# Altium integrated library 兰格封装.IntLib: 1176 symbols (part 3 of 6)
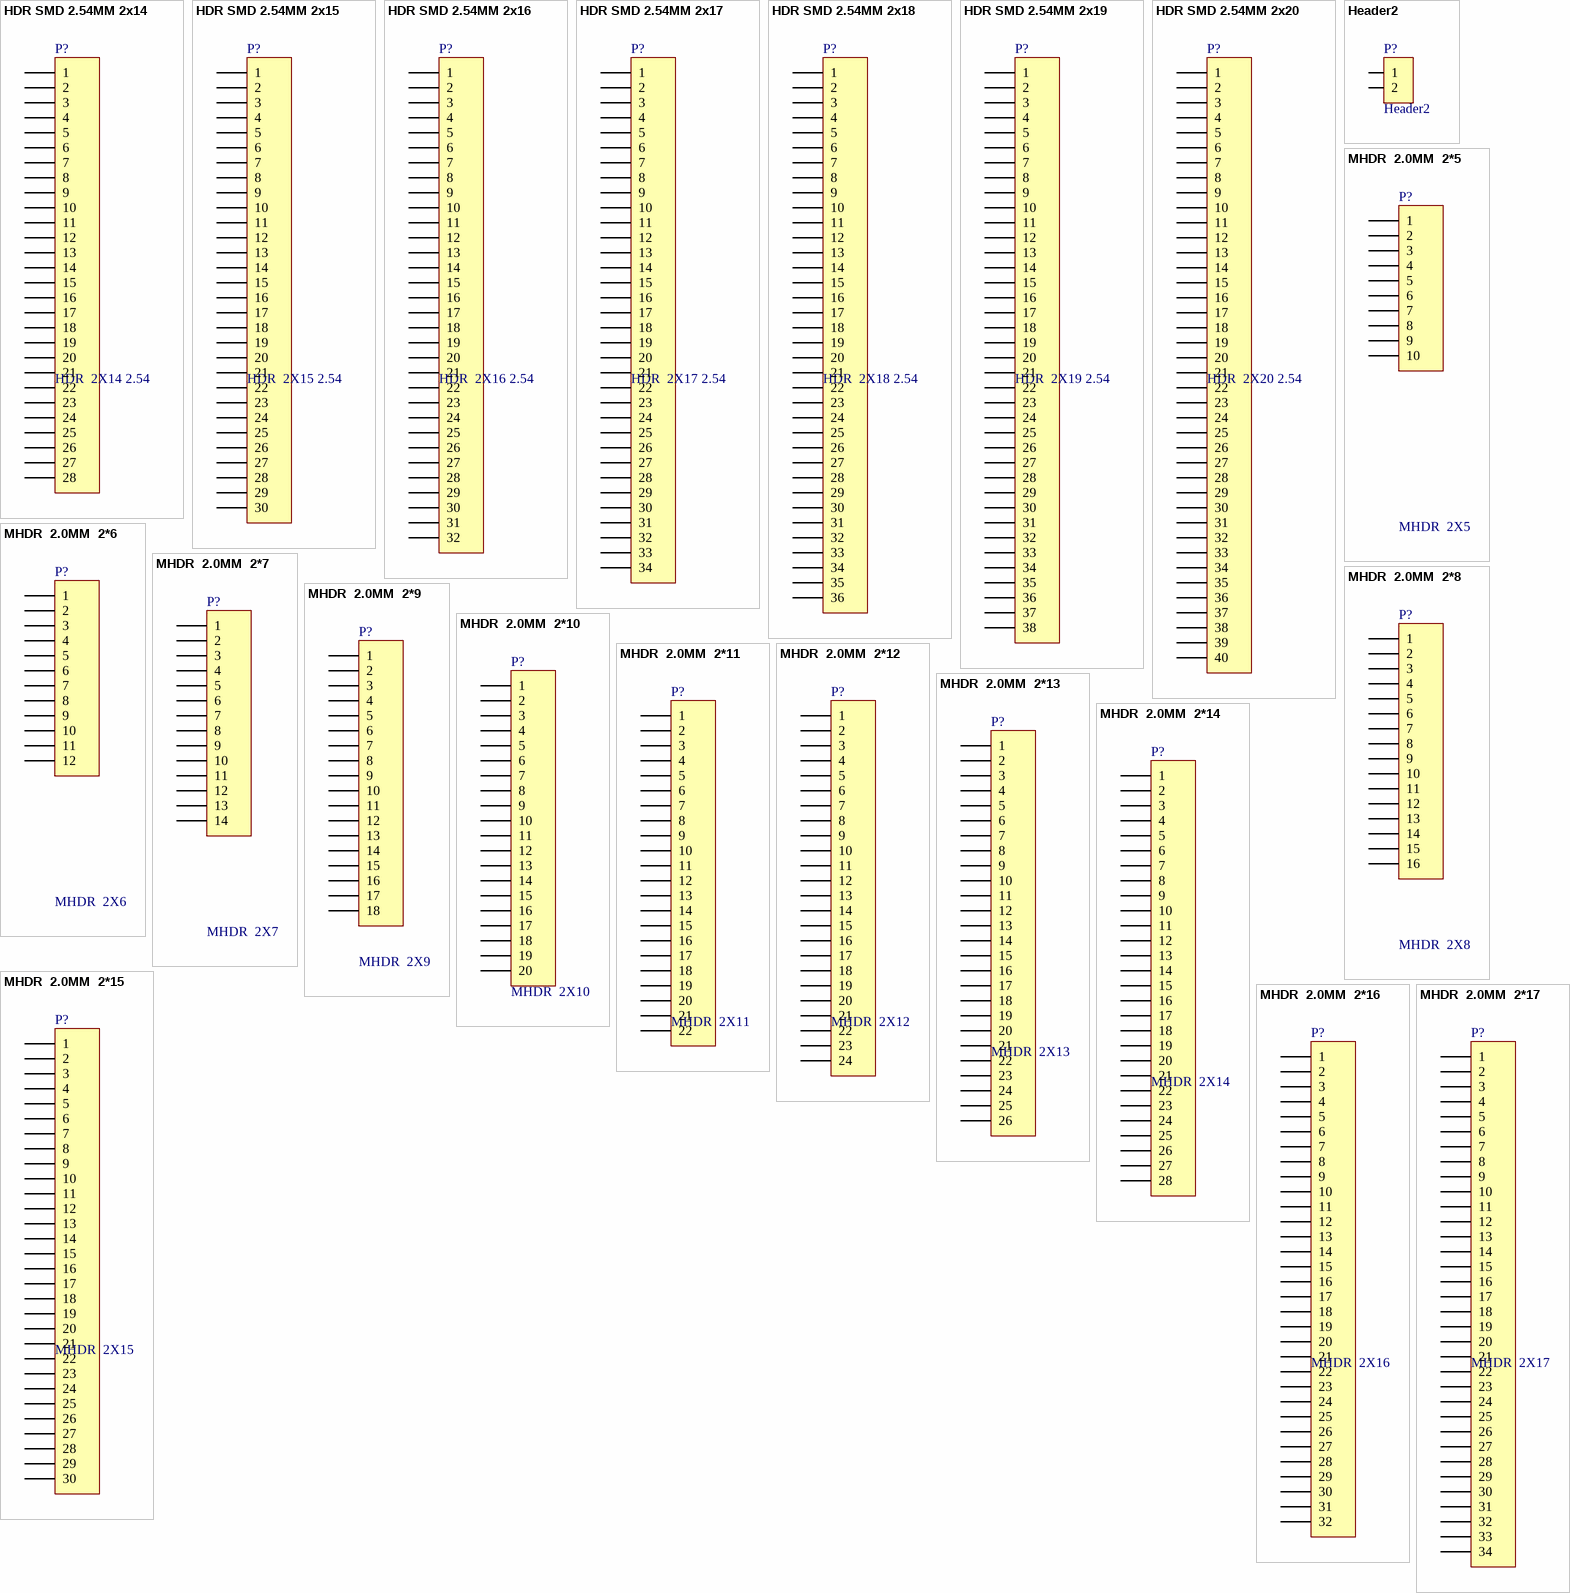
[diagram p50: symbols HDR SMD 2.54MM 2x14 to MHDR  2.0MM  2*17]

## MHDR  2.0MM  2*13
designator P?, comment MHDR  2X13
Header, 26-Pin  2.0MM; 仓库名称: 五金仓; 加工方式: 插件; 物料代码: *; 备注: *; 单位: *; 物料名称: *; 助记码: *; 规格型号: *
footprint MHDR  2.0MM  2*13 (26pins)
pins: 1, 2, 3, 4, 5, 6, 7, 8, 9, 10, 11, 12, 13, 14, 15, 16, 17, 18, 19, 20, 21, 22, 23, 24, 25, 26

## MHDR  2.0MM  2*14
designator P?, comment MHDR  2X14
Header, 28-Pin  2.0MM; 仓库名称: 五金仓; 加工方式: 插件; 物料代码: *; 备注: *; 助记码: *; 规格型号: *; 单位: *; 物料名称: *
footprint MHDR  2.0MM  2*14 (28pins)
pins: 1, 2, 3, 4, 5, 6, 7, 8, 9, 10, 11, 12, 13, 14, 15, 16, 17, 18, 19, 20, 21, 22, 23, 24, 25, 26, 27, 28

## MHDR  2.0MM  2*15
designator P?, comment MHDR  2X15
Header, 30-Pin  2.0MM; 仓库名称: 五金仓; 加工方式: 插件; 物料代码: *; 助记码: *; 备注: *; 物料名称: *; 单位: *; 规格型号: *
footprint MHDR  2.0MM  2*15 (30pins)
pins: 1, 2, 3, 4, 5, 6, 7, 8, 9, 10, 11, 12, 13, 14, 15, 16, 17, 18, 19, 20, 21, 22, 23, 24, 25, 26, 27, 28, 29, 30

## MHDR  2.0MM  2*16
designator P?, comment MHDR  2X16
Header, 32-Pin  2.0MM; 仓库名称: 五金仓; 加工方式: 插件; 助记码: *; 备注: *; 物料代码: *; 单位: *; 物料名称: *; 规格型号: *
footprint MHDR  2.0MM  2*16 (32pins)
pins: 1, 2, 3, 4, 5, 6, 7, 8, 9, 10, 11, 12, 13, 14, 15, 16, 17, 18, 19, 20, 21, 22, 23, 24, 25, 26, 27, 28, 29, 30, 31, 32

## MHDR  2.0MM  2*17
designator P?, comment MHDR  2X17
Header, 34-Pin  2.0MM; 仓库名称: 五金仓; 加工方式: 插件; 物料代码: *; 规格型号: *; 单位: *; 助记码: *; 备注: *; 物料名称: *
footprint MHDR  2.0MM  2*17 (34pins)
pins: 1, 2, 3, 4, 5, 6, 7, 8, 9, 10, 11, 12, 13, 14, 15, 16, 17, 18, 19, 20, 21, 22, 23, 24, 25, 26, 27, 28, 29, 30, 31, 32, 33, 34

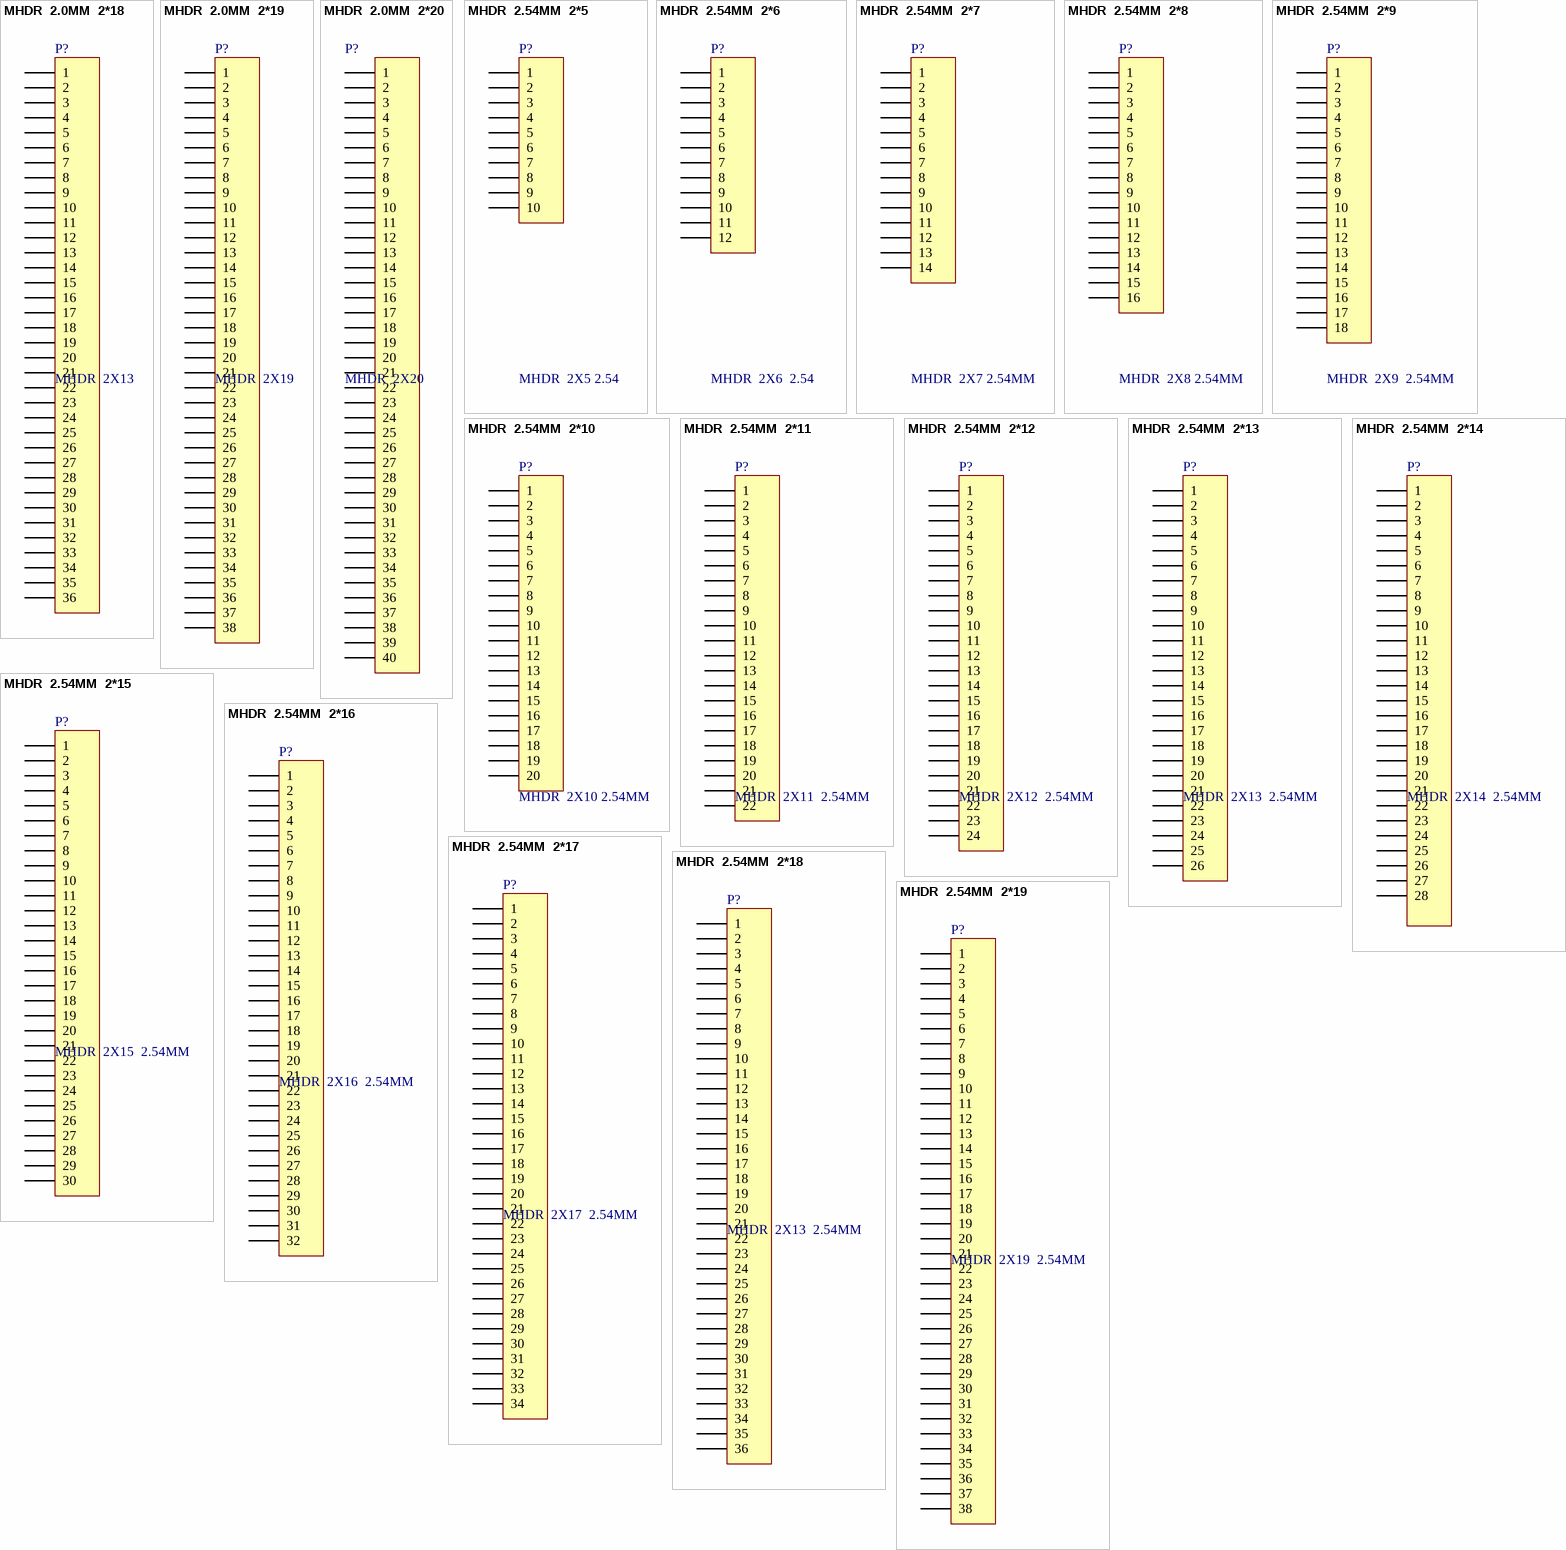
[diagram p23: symbols MHDR  2.0MM  2*18 to MHDR  2.54MM  2*19]

## MHDR  2.0MM  2*18
designator P?, comment MHDR  2X13
Header, 26-Pin  2.0MM; 仓库名称: 五金仓; 加工方式: 插件; 单位: *; 备注: *; 助记码: *; 物料名称: *; 物料代码: *; 规格型号: *
footprint MHDR  2.0MM  2*18 (36pins)
pins: 1, 2, 3, 4, 5, 6, 7, 8, 9, 10, 11, 12, 13, 14, 15, 16, 17, 18, 19, 20, 21, 22, 23, 24, 25, 26, 27, 28, 29, 30, 31, 32, 33, 34, 35, 36

## MHDR  2.0MM  2*19
designator P?, comment MHDR  2X19
Header, 38-Pin  2.0MM; 仓库名称: 五金仓; 加工方式: 插件; 物料代码: *; 助记码: *; 单位: *; 备注: *; 物料名称: *; 规格型号: *
footprint MHDR  2.0MM  2*19 (38pins)
pins: 1, 2, 3, 4, 5, 6, 7, 8, 9, 10, 11, 12, 13, 14, 15, 16, 17, 18, 19, 20, 21, 22, 23, 24, 25, 26, 27, 28, 29, 30, 31, 32, 33, 34, 35, 36, 37, 38

## MHDR  2.0MM  2*20
designator P?, comment MHDR  2X20
Header, 40-Pin  2.0MM; 仓库名称: 五金仓; 加工方式: 插件; 助记码: *; 单位: *; 备注: *; 物料代码: *; 物料名称: *; 规格型号: *
footprint MHDR  2.0MM  2*20 (40pins)
pins: 1, 2, 3, 4, 5, 6, 7, 8, 9, 10, 11, 12, 13, 14, 15, 16, 17, 18, 19, 20, 21, 22, 23, 24, 25, 26, 27, 28, 29, 30, 31, 32, 33, 34, 35, 36, 37, 38, 39, 40

## MHDR  2.54MM  2*5
designator P?, comment MHDR  2X5 2.54
Header, 10-Pin  2.54MM; 仓库名称: 五金仓; 加工方式: 插件; 助记码: *; 备注: *; 单位: *; 物料代码: *; 物料名称: *; 规格型号: *
footprint MHDR  2.0MM  2*5 (10pins)
pins: 1, 2, 3, 4, 5, 6, 7, 8, 9, 10

## MHDR  2.54MM  2*6
designator P?, comment MHDR  2X6  2.54
Header, 12-Pin  2.54MM; 仓库名称: 五金仓; 加工方式: 插件; 助记码: *; 单位: *; 备注: *; 物料名称: *; 规格型号: *; 物料代码: *
footprint MHDR  2.54MM  2*6 (12P)
pins: 1, 2, 3, 4, 5, 6, 7, 8, 9, 10, 11, 12

## MHDR  2.54MM  2*7
designator P?, comment MHDR  2X7 2.54MM
Header, 14-Pin  2.54MM; 仓库名称: 五金仓; 加工方式: 插件; 物料代码: *; 物料名称: *; 单位: *; 备注: *; 助记码: *; 规格型号: *
footprint MHDR  2.54MM  2*7 (14P)
pins: 1, 2, 3, 4, 5, 6, 7, 8, 9, 10, 11, 12, 13, 14

## MHDR  2.54MM  2*8
designator P?, comment MHDR  2X8 2.54MM
Header, 16-Pin  2.54MM; 仓库名称: 五金仓; 加工方式: 插件; 规格型号: *; 助记码: *; 物料名称: *; 物料代码: *; 备注: *; 单位: *
footprint MHDR  2.54MM  2*8 (16P)
pins: 1, 2, 3, 4, 5, 6, 7, 8, 9, 10, 11, 12, 13, 14, 15, 16

## MHDR  2.54MM  2*9
designator P?, comment MHDR  2X9  2.54MM
Header, 18-Pin  2.54MM; 仓库名称: 五金仓; 加工方式: 插件; 物料名称: *; 规格型号: *; 物料代码: *; 备注: *; 助记码: *; 单位: *
footprint MHDR  2.54MM  2*9 (18P)
pins: 1, 2, 3, 4, 5, 6, 7, 8, 9, 10, 11, 12, 13, 14, 15, 16, 17, 18

## MHDR  2.54MM  2*10
designator P?, comment MHDR  2X10 2.54MM
Header, 20-Pin  2.54MM; 仓库名称: 五金仓; 加工方式: 插件; 助记码: *; 单位: *; 备注: *; 物料代码: *; 物料名称: *; 规格型号: *
footprint MHDR  2.54MM  2*10 (20P)
pins: 1, 2, 3, 4, 5, 6, 7, 8, 9, 10, 11, 12, 13, 14, 15, 16, 17, 18, 19, 20

## MHDR  2.54MM  2*11
designator P?, comment MHDR  2X11  2.54MM
Header, 22-Pin  2.54MM; 仓库名称: 五金仓; 加工方式: 插件; 物料代码: *; 单位: *; 助记码: *; 规格型号: *; 物料名称: *; 备注: *
footprint MHDR  2.54MM  2*11 (22P)
pins: 1, 2, 3, 4, 5, 6, 7, 8, 9, 10, 11, 12, 13, 14, 15, 16, 17, 18, 19, 20, 21, 22

## MHDR  2.54MM  2*12
designator P?, comment MHDR  2X12  2.54MM
Header, 24-Pin  2.54MM; 仓库名称: 五金仓; 加工方式: 插件; 物料代码: *; 助记码: *; 备注: *; 单位: *; 物料名称: *; 规格型号: *
footprint MHDR  2.54MM  2*12 (24P)
pins: 1, 2, 3, 4, 5, 6, 7, 8, 9, 10, 11, 12, 13, 14, 15, 16, 17, 18, 19, 20, 21, 22, 23, 24

## MHDR  2.54MM  2*13
designator P?, comment MHDR  2X13  2.54MM
Header, 26-Pin  2.54MM; 仓库名称: 五金仓; 加工方式: 插件; 规格型号: *; 物料名称: *; 助记码: *; 物料代码: *; 备注: *; 单位: *
footprint MHDR  2.54MM  2*13 (26P)
pins: 1, 2, 3, 4, 5, 6, 7, 8, 9, 10, 11, 12, 13, 14, 15, 16, 17, 18, 19, 20, 21, 22, 23, 24, 25, 26

## MHDR  2.54MM  2*14
designator P?, comment MHDR  2X14  2.54MM
Header, 28-Pin  2.54MM; 仓库名称: 五金仓; 加工方式: 插件; 助记码: *; 备注: *; 单位: *; 物料代码: *; 物料名称: *; 规格型号: *
footprint MHDR  2.54MM  2*14 (28P)
pins: 1, 2, 3, 4, 5, 6, 7, 8, 9, 10, 11, 12, 13, 14, 15, 16, 17, 18, 19, 20, 21, 22, 23, 24, 25, 26, 27, 28

## MHDR  2.54MM  2*15
designator P?, comment MHDR  2X15  2.54MM
Header, 30-Pin  2.54MM; 仓库名称: 五金仓; 加工方式: 插件; 助记码: *; 物料名称: *; 备注: *; 单位: *; 物料代码: *; 规格型号: *
footprint MHDR  2.54MM  2*15 (30P)
pins: 1, 2, 3, 4, 5, 6, 7, 8, 9, 10, 11, 12, 13, 14, 15, 16, 17, 18, 19, 20, 21, 22, 23, 24, 25, 26, 27, 28, 29, 30

## MHDR  2.54MM  2*16
designator P?, comment MHDR  2X16  2.54MM
Header, 32-Pin  2.54MM; 仓库名称: 五金仓; 加工方式: 插件; 助记码: *; 物料名称: *; 单位: *; 物料代码: *; 备注: *; 规格型号: *
footprint MHDR  2.54MM  2*16 (32P)
pins: 1, 2, 3, 4, 5, 6, 7, 8, 9, 10, 11, 12, 13, 14, 15, 16, 17, 18, 19, 20, 21, 22, 23, 24, 25, 26, 27, 28, 29, 30, 31, 32

## MHDR  2.54MM  2*17
designator P?, comment MHDR  2X17  2.54MM
Header, 34-Pin  2.54MM; 仓库名称: 五金仓; 加工方式: 插件; 规格型号: *; 备注: *; 助记码: *; 单位: *; 物料代码: *; 物料名称: *
footprint MHDR  2.54MM  2*17 (34P)
pins: 1, 2, 3, 4, 5, 6, 7, 8, 9, 10, 11, 12, 13, 14, 15, 16, 17, 18, 19, 20, 21, 22, 23, 24, 25, 26, 27, 28, 29, 30, 31, 32, 33, 34

## MHDR  2.54MM  2*18
designator P?, comment MHDR  2X13  2.54MM
Header, 26-Pin  2.54MM; 仓库名称: 五金仓; 加工方式: 插件; 物料代码: *; 备注: *; 单位: *; 规格型号: *; 物料名称: *; 助记码: *
footprint MHDR  2.54MM  2*18 (36P)
pins: 1, 2, 3, 4, 5, 6, 7, 8, 9, 10, 11, 12, 13, 14, 15, 16, 17, 18, 19, 20, 21, 22, 23, 24, 25, 26, 27, 28, 29, 30, 31, 32, 33, 34, 35, 36

## MHDR  2.54MM  2*19
designator P?, comment MHDR  2X19  2.54MM
Header, 38-Pin  2.54MM; 仓库名称: 五金仓; 加工方式: 插件; 规格型号: *; 物料代码: *; 备注: *; 助记码: *; 物料名称: *
footprint MHDR  2.54MM  2*19 (38P)
pins: 1, 2, 3, 4, 5, 6, 7, 8, 9, 10, 11, 12, 13, 14, 15, 16, 17, 18, 19, 20, 21, 22, 23, 24, 25, 26, 27, 28, 29, 30, 31, 32, 33, 34, 35, 36, 37, 38

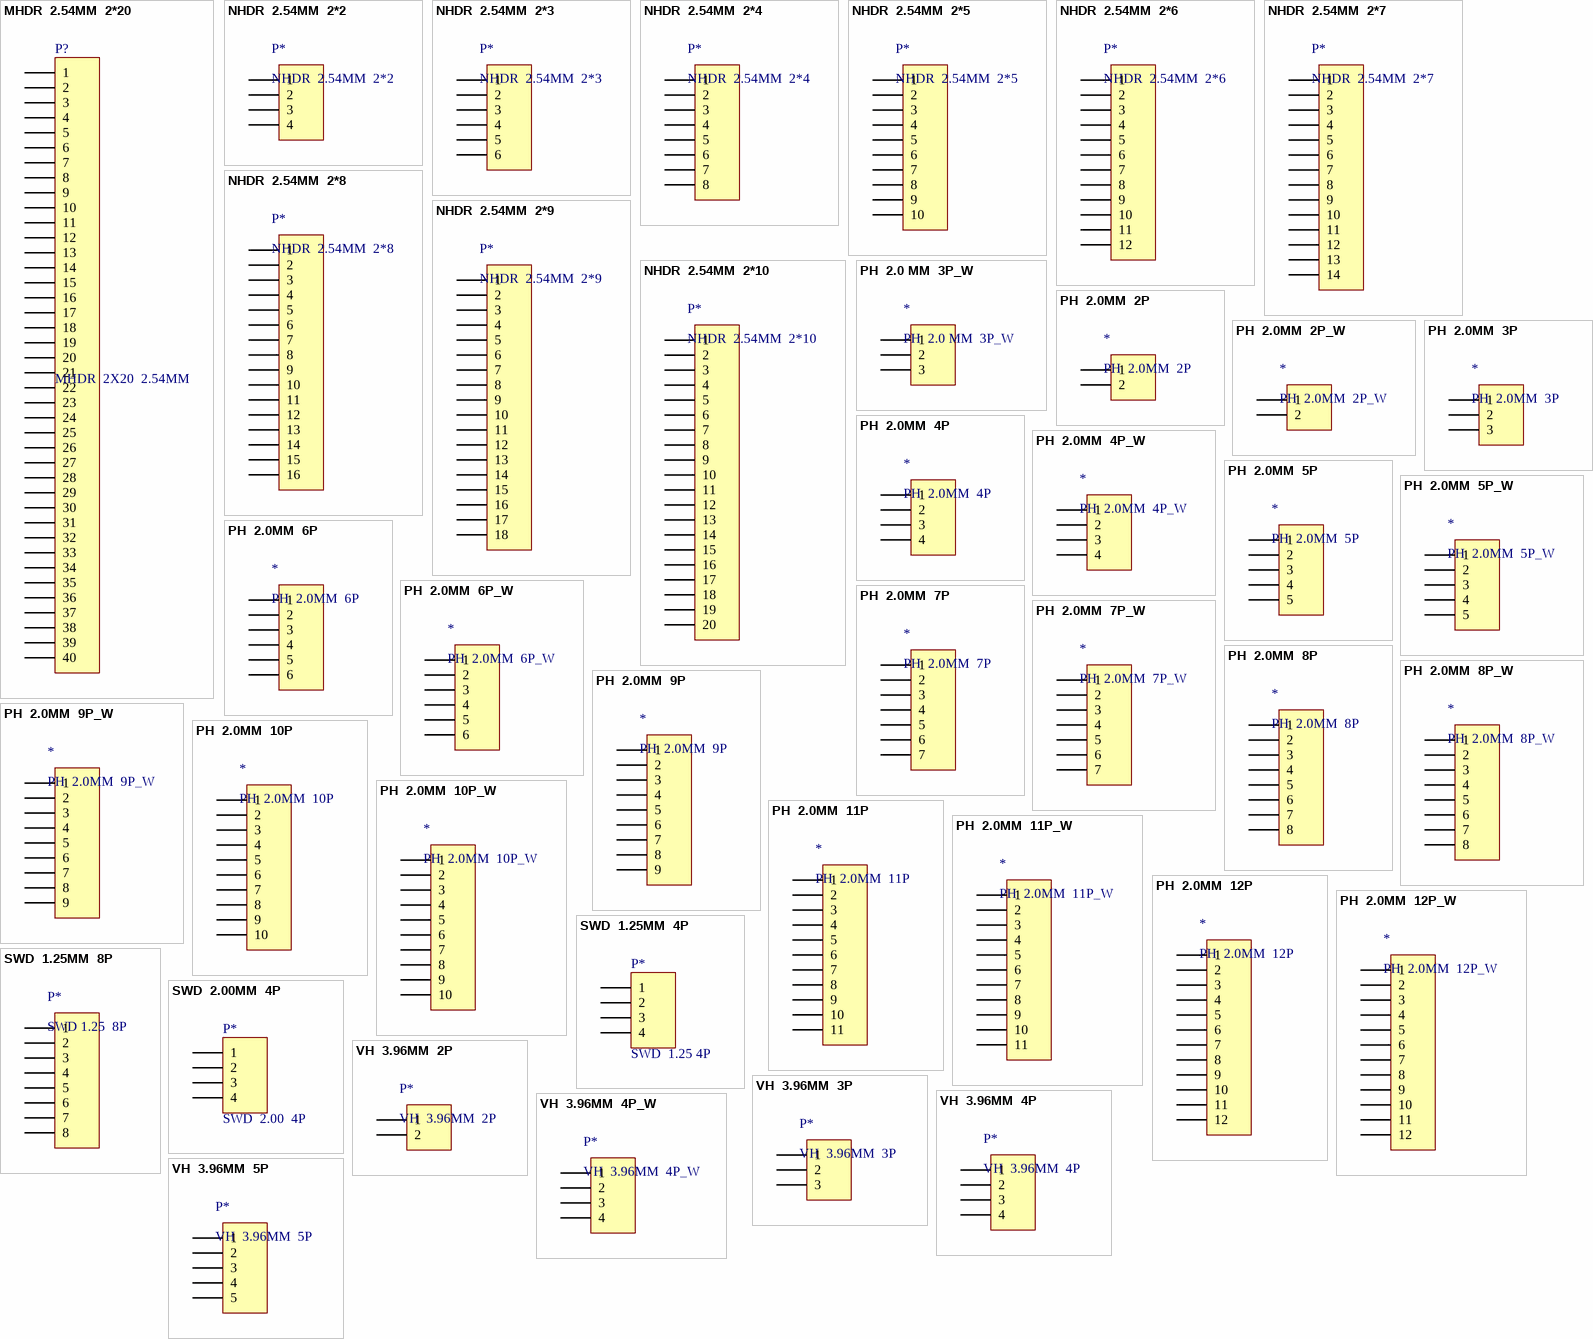
[diagram p24: symbols MHDR  2.54MM  2*20 to VH  3.96MM  5P]

## MHDR  2.54MM  2*20
designator P?, comment MHDR  2X20  2.54MM
Header, 40-Pin  2.54MM; 仓库名称: 五金仓; 加工方式: 插件; 物料代码: *; 物料名称: *; 单位: *; 备注: *; 规格型号: *; 助记码: *
footprint MHDR  2.54MM  2*20 (40P)
pins: 1, 2, 3, 4, 5, 6, 7, 8, 9, 10, 11, 12, 13, 14, 15, 16, 17, 18, 19, 20, 21, 22, 23, 24, 25, 26, 27, 28, 29, 30, 31, 32, 33, 34, 35, 36, 37, 38, 39, 40

## NHDR  2.54MM  2*2
designator P*
单位: ֻ; 加工方式: 插件; 仓库名称: 五金仓; 物料代码: *; 物料名称: *; 助记码: *; 规格型号: *; 备注: *
footprint NHDR  2.54MM  2*2 (脚距：2.54mm，直插双排母)
pins: 1, 2, 3, 4

## NHDR  2.54MM  2*3
designator P*
单位: ֻ; 加工方式: 插件; 仓库名称: 五金仓; 物料代码: *; 物料名称: *; 助记码: *; 规格型号: *; 备注: *
footprint NHDR  2.54MM  2*3 (脚距：2.54mm，直插双排母)
pins: 1, 2, 3, 4, 5, 6

## NHDR  2.54MM  2*4
designator P*
单位: ֻ; 加工方式: 插件; 仓库名称: 五金仓; 物料代码: *; 物料名称: *; 助记码: *; 规格型号: *; 备注: *
footprint NHDR  2.54MM  2*4 (脚距：2.54mm，直插双排母)
pins: 1, 2, 3, 4, 5, 6, 7, 8

## NHDR  2.54MM  2*5
designator P*
单位: ֻ; 加工方式: 插件; 仓库名称: 五金仓; 物料代码: *; 物料名称: *; 助记码: *; 规格型号: *; 备注: *
footprint NHDR  2.54MM  2*5 (脚距：2.54mm，直插双排母)
pins: 1, 2, 3, 4, 5, 6, 7, 8, 9, 10

## NHDR  2.54MM  2*6
designator P*
单位: ֻ; 加工方式: 插件; 仓库名称: 五金仓; 物料代码: *; 物料名称: *; 助记码: *; 规格型号: *; 备注: *
footprint NHDR  2.54MM  2*6 (脚距：2.54mm，直插双排母)
pins: 1, 2, 3, 4, 5, 6, 7, 8, 9, 10, 11, 12

## NHDR  2.54MM  2*7
designator P*
单位: ֻ; 加工方式: 插件; 仓库名称: 五金仓; 物料代码: *; 物料名称: *; 助记码: *; 规格型号: *; 备注: *
footprint NHDR  2.54MM  2*7 (脚距：2.54mm，直插双排母)
pins: 1, 2, 3, 4, 5, 6, 7, 8, 9, 10, 11, 12, 13, 14
